# Altium footprint library main.PcbLib: 217 footprints (part 14 of 14)
Each footprint in its own frame and in the unit in brackets; x right, y up, seen from the top. Pads: shape width x height; smd on the part's side, far side on the other; paste and mask are expansions set on the pad; w line width, h text height; cw(c..) or ccw(c..) is an arc to the next point about the centre after c.
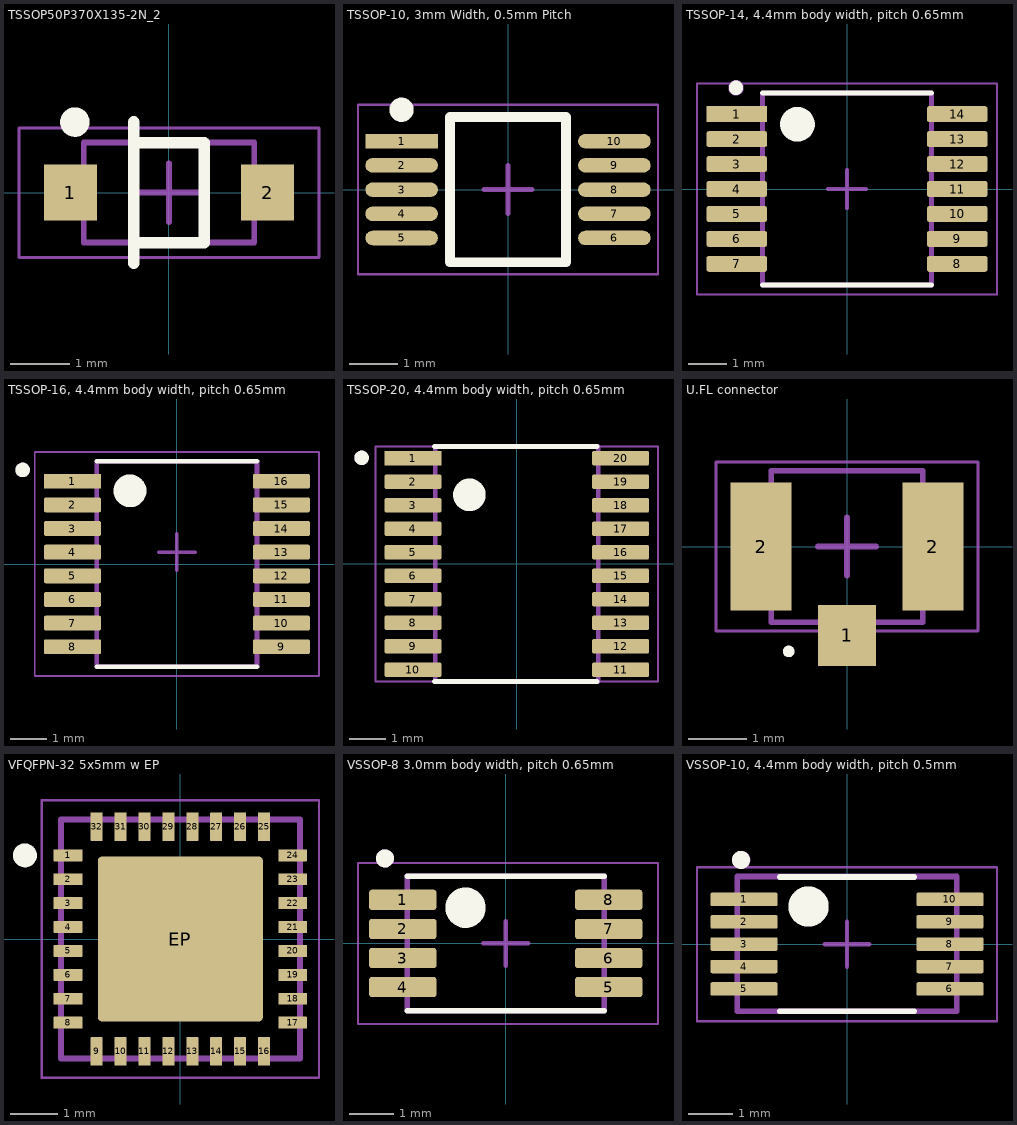
[diagram p13: the footprints below, top view; thin cyan lines are the x and y axes]

## TSSOP50P370X135-2N_2 [mm] "TSSOP, 2-Leads, Body 1.55x2.70mm, Pitch 0.50mm, IPC Medium Density"
height 1.35
pads (2):
  rect 0.9x0.95 smd: 1(-1.675,0) 2(1.675,0)
Top Overlay:
  circle w0.25: c-1.6,1.2 r0.125
  lines w0.2: -0.6,-1.2 -0.6,1.2 ; -0.6,-0.85 -0.6,0.85 0.6,0.85 0.6,-0.85 -0.6,-0.85
Mechanical 7:
  text ".Designator" at -1.651,-0.762 h0.76
Mechanical 13:
  lines w0.1: -1.45,-0.85 -1.45,0.85 1.45,0.85 1.45,-0.85 -1.45,-0.85
Mechanical 15:
  lines w0.05: -2.55,-1.1 -2.55,1.1 ; -2.55,-1.1 2.55,-1.1 ; -2.55,-1.1 2.55,-1.1 ; -2.55,-1.1 -2.55,1.1 ; -2.55,1.1 2.55,1.1 ; -2.55,1.1 2.55,1.1 ; 2.55,-1.1 2.55,1.1 ; 2.55,-1.1 2.55,1.1
  lines w0.1: -0.5,0 0.5,0 -0.5,0 ; 0,-0.5 0,0.5 0,-0.5
3D body "TSSOP50P370X135-2N.step": height 1.35, standoff 0, extent -1.849,-0.85 1.849,0.85

## TSSOP-10, 3mm Width, 0.5mm Pitch [mm]
height 2.65
pads (10):
  rect 1.5x0.3 smd mask+0.05: 1(-2.2,1)
  oval 1.5x0.3 smd mask+0.05: 2(-2.2,0.5) 3(-2.2,0) 4(-2.2,-0.5) 5(-2.2,-1) 6(2.2,-1) 7(2.2,-0.5) 8(2.2,0) 9(2.2,0.5) 10(2.2,1)
Top Overlay:
  circle w0.25: c-2.2,1.65 r0.125
  lines w0.2: -1.2,-1.5 -1.2,1.5 1.2,1.5 1.2,-1.5 -1.2,-1.5
Mechanical 15:
  lines w0.05: -3.1,-1.75 -3.1,1.75 3.1,1.75 3.1,-1.75 -3.1,-1.75
  lines w0.1: -0.5,0 0.5,0 ; 0,-0.5 0,0.5
3D body "User Library-IPC SOSOP50P490X109-10N MO-187BA MUB10A.STEP": height 1.24, standoff 0, extent -2.478,-1.55 2.478,1.55

## TSSOP-14, 4.4mm body width, pitch 0.65mm [mm] "TSOP, 14-Leads, Body 4.40mm width, Pitch 0.65mm"
height 1.1
pads (14):
  rect 1.57x0.41 smd mask+0.076: 1(-2.87,1.95)
  rrect25% 1.57x0.41 smd mask+0.076: 2(-2.87,1.3) 3(-2.87,0.65) 4(-2.87,0) 5(-2.87,-0.65) 6(-2.87,-1.3) 7(-2.87,-1.95) 8(2.87,-1.95) 9(2.87,-1.3) 10(2.87,-0.65) 11(2.87,0) 12(2.87,0.65) 13(2.87,1.3) 14(2.87,1.95)
Top Overlay:
  circle w0.2: c-2.89,2.635 r0.086
  circle w0.6: c-1.289,1.685 r0.15
  lines w0.127: -2.2,-2.5 2.2,-2.5 ; -2.2,2.5 2.2,2.5
Mechanical 7:
  text ".Designator" at -2.57,-0.572 h1.52
Mechanical 13:
  circle w0.2: c-2.89,2.635 r0.1
  lines w0.127: -2.2,-2.5 2.2,-2.5 2.2,2.5 -2.2,2.5 -2.2,-2.5
Mechanical 15:
  lines w0.05: -3.905,-2.75 3.905,-2.75 3.905,2.75 -3.905,2.75 -3.905,-2.75
  lines w0.1: -0.5,0 0.5,0 ; 0,-0.5 0,0.5
3D body "PW0014A.stp": height 1.13, standoff 0, extent -3.2,-2.5 3.2,2.5

## TSSOP-16, 4.4mm body width, pitch 0.65mm [mm] "TSOP, 16-Leads, Body 4.40mm width, Pitch 0.65mm"
height 1.1
pads (16):
  rect 1.57x0.41 smd mask+0.076: 1(-2.87,2.275)
  rrect25% 1.57x0.41 smd mask+0.076: 2(-2.87,1.625) 3(-2.87,0.975) 4(-2.87,0.325) 5(-2.87,-0.325) 6(-2.87,-0.975) 7(-2.87,-1.625) 8(-2.87,-2.275) 9(2.87,-2.275) 10(2.87,-1.625) 11(2.87,-0.975) 12(2.87,-0.325) 13(2.87,0.325) 14(2.87,0.975) 15(2.87,1.625) 16(2.87,2.275)
Top Overlay:
  circle w0.6: c-1.289,2.01 r0.15
  circle w0.2: c-4.24,2.585 r0.1
  lines w0.127: -2.2,-2.825 2.2,-2.825 ; -2.2,2.825 2.2,2.825
Mechanical 7:
  text ".Designator" at -2.57,-0.247 h1.52
Mechanical 13:
  circle w0.2: c-4.24,2.585 r0.1
  lines w0.127: -2.2,-2.825 -2.2,2.825 2.2,2.825 2.2,-2.825 -2.2,-2.825
Mechanical 15:
  lines w0.05: -3.905,-3.075 -3.905,3.075 3.905,3.075 3.905,-3.075 -3.905,-3.075
  lines w0.1: -0.5,0.325 0.5,0.325 ; 0,-0.175 0,0.825
3D body "User Library-JEDEC MO-153 (TSSOP).step": height 1.2, standoff 0, extent -3.228,-2.5 3.228,2.5

## TSSOP-20, 4.4mm body width, pitch 0.65mm [mm] "TSOP, 20-Leads, Body 4.40mm width, Pitch 0.65mm"
height 1.1
pads (20):
  rect 1.57x0.41 smd mask+0.076: 1(-2.87,2.925)
  rrect25% 1.57x0.41 smd mask+0.076: 2(-2.87,2.275) 3(-2.87,1.625) 4(-2.87,0.975) 5(-2.87,0.325) 6(-2.87,-0.325) 7(-2.87,-0.975) 8(-2.87,-1.625) 9(-2.87,-2.275) 10(-2.87,-2.925) 11(2.87,-2.925) 12(2.87,-2.275) 13(2.87,-1.625) 14(2.87,-0.975) 15(2.87,-0.325) 16(2.87,0.325) 17(2.87,0.975) 18(2.87,1.625) 19(2.87,2.275) 20(2.87,2.925)
Top Overlay:
  circle w0.2: c-4.29,2.935 r0.1
  circle w0.6: c-1.308,1.912 r0.15
  lines w0.127: -2.275,-3.25 2.225,-3.25 ; -2.275,3.25 2.225,3.25
Mechanical 7:
  text ".Designator" at -2.57,-0.572 h1.52
Mechanical 13:
  circle w0.2: c-4.29,2.935 r0.1
  lines w0.127: -2.25,-3.25 2.25,-3.25 2.25,3.25 -2.25,3.25 -2.25,-3.25
Mechanical 15:
  lines w0.05: -3.905,-3.25 3.905,-3.25 3.905,3.25 -3.905,3.25 -3.905,-3.25
3D body "User Library-TSSOP20.step": height 1.09, standoff 0, extent -3.14,-3.35 3.14,3.15

## U.FL connector [mm] "U.FL connector"
height 0.7
pads (3):
  rect 1x1.05 smd: 1(0,-1.525)
  rect 1.05x2.2 smd: 2(-1.475,0) 2(1.475,0)
Top Overlay:
  circle w0.1: c-1,-1.8 r0.05
Mechanical 7:
  text ".Designator" at -1.4,-0.5 h1
Mechanical 13:
  lines w0.1: -1.3,-1.3 1.3,-1.3 1.3,1.3 -1.3,1.3 -1.3,-1.3
Mechanical 15:
  lines w0.05: -2.25,-1.45 2.25,-1.45 2.25,1.45 -2.25,1.45 -2.25,-1.45
  lines w0.1: -0.5,0 0.5,0 ; 0,-0.5 0,0.5
3D body: height 0.35, standoff 0, extent -1.3,-1.3 1.3,1.3
3D body: height 1.25, standoff 0, extent -0.996,-0.998 0.996,0.998

## VFQFPN-32 5x5mm w EP [mm] "VFQFPN-32 5x5mm w EP"
pads (33):
  rrect10% 0.6x0.25 smd: 1(-2.35,1.75) 2(-2.35,1.25) 3(-2.35,0.75) 4(-2.35,0.25) 5(-2.35,-0.25) 6(-2.35,-0.75) 7(-2.35,-1.25) 8(-2.35,-1.75) 17(2.35,-1.75) 18(2.35,-1.25) 19(2.35,-0.75) 20(2.35,-0.25) 21(2.35,0.25) 22(2.35,0.75) 23(2.35,1.25) 24(2.35,1.75)
  rrect10% 0.25x0.6 smd: 9(-1.75,-2.35) 10(-1.25,-2.35) 11(-0.75,-2.35) 12(-0.25,-2.35) 13(0.25,-2.35) 14(0.75,-2.35) 15(1.25,-2.35) 16(1.75,-2.35) 25(1.75,2.35) 26(1.25,2.35) 27(0.75,2.35) 28(0.25,2.35) 29(-0.25,2.35) 30(-0.75,2.35) 31(-1.25,2.35) 32(-1.75,2.35)
  rrect5% 3.45x3.45 smd: EP(0,0)
Top Overlay:
  circle w0.25: c-3.25,1.75 r0.125
Mechanical 7:
  text ".Designator" at -0.8,-0.5 h1.52
Mechanical 13:
  lines w0.127: -2.5,-2.5 2.5,-2.5 2.5,2.5 -2.5,2.5 -2.5,-2.5
  lines w0.2: -3.153,1.724 ccw(c-3.25,1.75) -3.151,1.74
Mechanical 15:
  lines w0.05: -2.9,-2.9 2.9,-2.9 2.9,2.9 -2.9,2.9 -2.9,-2.9
3D body "User Library-QFN-32-5x5 - EQ.STEP": height 0.85, standoff 0, extent -2.5,-2.5 2.5,2.5

## VSSOP-8 3.0mm body width, pitch 0.65mm [mm] "VSSOP-8 3.0mm body width, pitch 0.65mm"
height 1.1
pads (8):
  rrect25% 1.5x0.45 smd: 1(-2.3,0.975) 2(-2.3,0.325) 3(-2.3,-0.325) 4(-2.3,-0.975) 5(2.3,-0.975) 6(2.3,-0.325) 7(2.3,0.325) 8(2.3,0.975)
Top Overlay:
  circle w0.2: c-2.7,1.9 r0.1
  circle w0.6: c-0.9,0.8 r0.15
  lines w0.127: -2.2,-1.5 2.2,-1.5 ; -2.2,1.5 2.2,1.5
Mechanical 7:
  text ".Designator" at -2.57,-0.572 h1.52
Mechanical 13:
  circle w0.2: c-2.7,1.9 r0.1
  lines w0.127: -2.2,-1.5 2.2,-1.5 2.2,1.5 -2.2,1.5 -2.2,-1.5
Mechanical 15:
  lines w0.05: -3.3,-1.8 3.4,-1.8 3.4,1.8 -3.3,1.8 -3.3,-1.8
  lines w0.1: -0.5,0 0.5,0 ; 0,-0.5 0,0.5
3D body "User Library-TSSOP-8 3_1x3_1.STEP": height 1.1, standoff 0, extent -2.6,-1.55 2.4,1.55

## VSSOP-10, 4.4mm body width, pitch 0.5mm [mm] "VSSOP-10, 4.4mm body width, pitch 0.5mm"
height 1.1
pads (10):
  rrect25% 1.5x0.3 smd: 1(-2.3,1) 2(-2.3,0.5) 3(-2.3,0) 4(-2.3,-0.5) 5(-2.3,-1) 6(2.3,-1) 7(2.3,-0.5) 8(2.3,0) 9(2.3,0.5) 10(2.3,1)
Top Overlay:
  circle w0.2: c-2.37,1.88 r0.1
  circle w0.6: c-0.86,0.84 r0.15
  lines w0.127: -1.5,-1.5 1.5,-1.5 ; -1.5,1.5 1.5,1.5
Mechanical 7:
  text ".Designator" at -2.57,-0.572 h1.52
Mechanical 13:
  circle w0.2: c-2.36,1.88 r0.1
  lines w0.127: -2.45,-1.5 2.45,-1.5 2.45,1.51 -2.45,1.51 -2.45,-1.5
Mechanical 15:
  lines w0.05: -3.35,-1.72 3.35,-1.72 3.35,1.72 -3.35,1.72 -3.35,-1.72
  lines w0.1: -0.5,0 0.5,0 ; 0,-0.5 0,0.5
3D body "DGS0010A.stp": height 1.09, standoff -0.01, extent -2.463,-1.5 2.462,1.5